# Altium footprint library Audio-Beamformer.PcbLib: 47 footprints (part 3 of 3)
Each footprint in its own frame and in the unit in brackets; x right, y up, seen from the top. Pads: shape width x height; smd on the part's side, far side on the other; paste and mask are expansions set on the pad; w line width, h text height; cw(c..) or ccw(c..) is an arc to the next point about the centre after c.
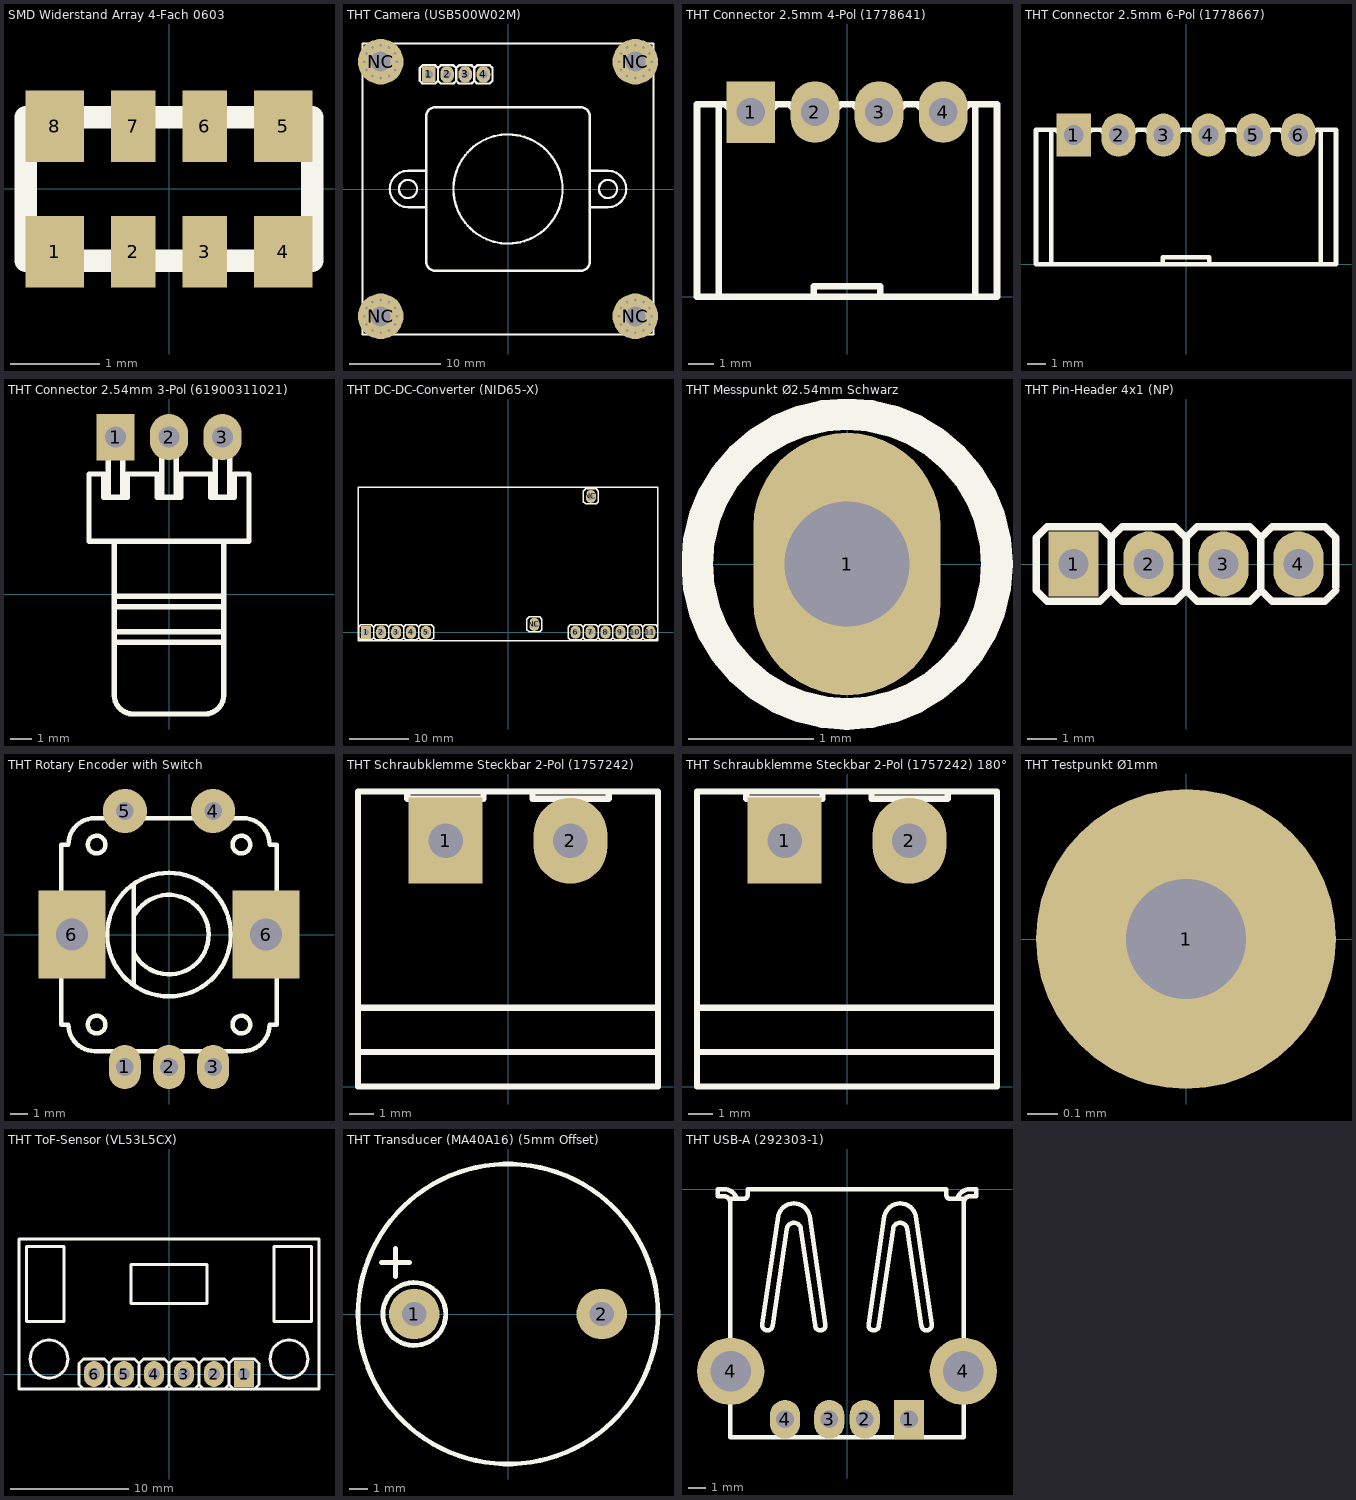
[diagram p2: the footprints below, top view; thin cyan lines are the x and y axes]

## SMD Widerstand Array 4-Fach 0603 [mm]
pads (8):
  rect 0.65x0.8 smd: 1(-1.275,-0.7) 4(1.275,-0.7) 5(1.275,0.7) 8(-1.275,0.7)
  rect 0.5x0.8 smd: 2(-0.4,-0.7) 3(0.4,-0.7) 6(0.4,0.7) 7(-0.4,0.7)
Top Overlay:
  lines w0.254: -1.6,-0.8 -1.6,0.8 1.6,0.8 1.6,-0.8 -1.6,-0.8
3D body "User Library-R-0603-Array-4-1.step": height 0.51, standoff -0.01, extent -1.6,-0.8 1.6,0.8

## THT Camera (USB500W02M) [mm] "Capacitor, Electrolytic, Radial; Body 5 x 5 mm (Dia.xH typ); Pin Spacing 2 mm (typ)"
height 6
pads (8):
  rect 1.5x1.8 hole 0.85: 1(-8.7,12.6)
  oval 1.5x1.8 hole 0.85: 2(-6.7,12.6) 3(-4.7,12.6) 4(-2.7,12.6)
  round 5 hole 2.2: NC(-14,-14) NC(-14,14) NC(14,-14) NC(14,14)
via 13.1,-15.559 diameter 0.62 hole 0.3
via 12.441,-13.1 diameter 0.62 hole 0.3
via 15.559,-14.9 diameter 0.62 hole 0.3
via 14.9,-12.441 diameter 0.62 hole 0.3
via 12.2,-14 diameter 0.62 hole 0.3
via 14,-12.2 diameter 0.62 hole 0.3
via 14,-15.8 diameter 0.62 hole 0.3
via 15.8,-14 diameter 0.62 hole 0.3
via 12.441,-14.9 diameter 0.62 hole 0.3
via 13.1,-12.441 diameter 0.62 hole 0.3
via 14.9,-15.559 diameter 0.62 hole 0.3
via 15.559,-13.1 diameter 0.62 hole 0.3
via -14.9,-15.559 diameter 0.62 hole 0.3
via -15.559,-13.1 diameter 0.62 hole 0.3
via -12.441,-14.9 diameter 0.62 hole 0.3
via -13.1,-12.441 diameter 0.62 hole 0.3
via -15.8,-14 diameter 0.62 hole 0.3
via -14,-12.2 diameter 0.62 hole 0.3
via -14,-15.8 diameter 0.62 hole 0.3
via -12.2,-14 diameter 0.62 hole 0.3
via -15.559,-14.9 diameter 0.62 hole 0.3
via -14.9,-12.441 diameter 0.62 hole 0.3
via -13.1,-15.559 diameter 0.62 hole 0.3
via -12.441,-13.1 diameter 0.62 hole 0.3
via -14.9,12.441 diameter 0.62 hole 0.3
via -15.559,14.9 diameter 0.62 hole 0.3
via -12.441,13.1 diameter 0.62 hole 0.3
via -13.1,15.559 diameter 0.62 hole 0.3
via -15.8,14 diameter 0.62 hole 0.3
via -14,15.8 diameter 0.62 hole 0.3
via -14,12.2 diameter 0.62 hole 0.3
via -12.2,14 diameter 0.62 hole 0.3
via -15.559,13.1 diameter 0.62 hole 0.3
via -14.9,15.559 diameter 0.62 hole 0.3
via -13.1,12.441 diameter 0.62 hole 0.3
via -12.441,14.9 diameter 0.62 hole 0.3
via 13.1,12.441 diameter 0.62 hole 0.3
via 12.441,14.9 diameter 0.62 hole 0.3
via 15.559,13.1 diameter 0.62 hole 0.3
via 14.9,15.559 diameter 0.62 hole 0.3
via 12.2,14 diameter 0.62 hole 0.3
via 14,15.8 diameter 0.62 hole 0.3
via 14,12.2 diameter 0.62 hole 0.3
via 15.8,14 diameter 0.62 hole 0.3
via 12.441,13.1 diameter 0.62 hole 0.3
via 13.1,15.559 diameter 0.62 hole 0.3
via 14.9,12.441 diameter 0.62 hole 0.3
via 15.559,14.9 diameter 0.62 hole 0.3
Top Overlay:
  circle w0.254: c11,0 r1
  circle w0.254: c-11,0 r1
  circle w0.254: c0,0 r6
  lines w0.254: -9,-2 -11,-2 cw(c-11,0) -11,2 -9,2 ; 9,-2 11,-2 ccw(c11,0) 11,2 9,2 ; -7.7,11.9 -7.4,11.6 -6,11.6 -5.7,11.9 ; -7.7,11.9 -7.7,13.3 ; -7.7,11.9 -8,11.6 -9.4,11.6 -9.7,11.9 -9.7,13.3 -9.4,13.6 -8,13.6 -7.7,13.3 ; -7.7,13.3 -7.4,13.6 -6,13.6 -5.7,13.3 ; -5.7,11.9 -5.4,11.6 -4,11.6 -3.7,11.9 ; -5.7,11.9 -5.7,13.3 ; -5.7,13.3 -5.4,13.6 -4,13.6 -3.7,13.3 ; -3.7,11.9 -3.7,13.3 ; -3.7,11.9 -3.4,11.6 -2,11.6 -1.7,11.9 -1.7,13.3 -2,13.6 -3.4,13.6 -3.7,13.3 ; -16,-16 -16,16 16,16 16,-16 -16,-16 ; -9,-8 ccw(c-8,-8) -8,-9 0,-9 8,-9 ccw(c8,-8) 9,-8 9,0 9,8 ccw(c8,8) 8,9 0,9 -8,9 ccw(c-8,8) -9,8 -9,0 -9,-8
3D body "Camera.x_t": height 21.12, standoff -2.35, extent -16.247,-16.25 16.247,16.25

## THT Connector 2.5mm 4-Pol (1778641) [mm] "Capacitor, Electrolytic, Radial; Body 5 x 5 mm (Dia.xH typ); Pin Spacing 2 mm (typ)"
height 6
pads (4):
  rect 1.9x2.4 hole 1.1: 1(-3.75,7.2)
  oval 1.9x2.4 hole 1.1: 2(-1.25,7.2) 3(1.25,7.2) 4(3.75,7.2)
Top Overlay:
  lines w0.254: -5,0 -5,7.5 ; -1.3,0 -1.3,0.4 0,0.4 1.3,0.4 1.3,0 ; 5,0 5,7.5 ; -5.85,0 -5.85,7 -5.85,7.5 -4.75,7.5 -4.25,7 -3.25,7 -2.75,7.5 -2.25,7.5 -1.75,7 -0.75,7 -0.25,7.5 0.25,7.5 0.75,7 1.75,7 2.25,7.5 2.5,7.5 2.75,7.5 3.25,7 4.25,7 4.75,7.5 5.85,7.5 5.85,7 5.85,0 2.5,0 -5.85,0
3D body "pxc_1778641_03_PTSM-0-5-4-HH-2-5-THR-R32_3D.stp": height 5.04, standoff -2.08, extent -5.86,0 5.86,7.5
3D body "pxc_1778858_02_PTSM-0-5-4-P-2-5_3D.stp": height 5.02, standoff 0.02, extent -5.55,-10.5 5.55,4.5

## THT Connector 2.5mm 6-Pol (1778667) [mm] "Capacitor, Electrolytic, Radial; Body 5 x 5 mm (Dia.xH typ); Pin Spacing 2 mm (typ)"
height 6
pads (6):
  rect 1.9x2.4 hole 1.1: 1(-6.25,7.2)
  oval 1.9x2.4 hole 1.1: 2(-3.75,7.2) 3(-1.25,7.2) 4(1.25,7.2) 5(3.75,7.2) 6(6.25,7.2)
Top Overlay:
  lines w0.254: -7.5,0 -7.5,7.5 ; -1.3,0 -1.3,0.4 0,0.4 1.3,0.4 1.3,0 ; 7.5,0 7.5,7.5 ; -8.35,0 0,0 8.35,0 8.35,7 8.35,7.5 7.25,7.5 6.75,7 5.75,7 5.25,7.5 4.75,7.5 4.25,7 3.25,7 2.75,7.5 2.25,7.5 1.75,7 0.75,7 0.25,7.5 0,7.5 -0.25,7.5 -0.75,7 -1.75,7 -2.25,7.5 -2.75,7.5 -3.25,7 -4.25,7 -4.75,7.5 -5.25,7.5 -5.75,7 -6.75,7 -7.25,7.5 -8.35,7.5 -8.35,7 -8.35,0
3D body "pxc_1778874_02_PTSM-0-5-6-P-2-5_3D.stp": height 5.02, standoff 0.02, extent -8.05,-10.5 8.05,4.5
3D body "pxc_1778667_03_PTSM-0-5-6-HH-2-5-THR-R32_3D.stp": height 5.04, standoff -2.08, extent -8.36,0 8.36,7.5

## THT Connector 2.54mm 3-Pol (61900311021) [mm] "Capacitor, Electrolytic, Radial; Body 5 x 5 mm (Dia.xH typ); Pin Spacing 2 mm (typ)"
height 6
pads (3):
  rect 1.8x2.2 hole 1: 1(-2.54,7.45)
  oval 1.8x2.2 hole 1: 2(0,7.45) 3(2.54,7.45)
Top Overlay:
  lines w0.254: -2.89,4.62 -2.89,7.8 -2.54,7.8 -2.19,7.8 -2.19,4.62 ; -2.6,-2.3 2.6,-2.3 ; -2.6,-1.8 2.6,-1.8 ; -2.6,-0.6 2.6,-0.6 ; -2.6,-0.1 2.6,-0.1 ; -2.6,2.5 -2.6,-4.8 ccw(c-1.7,-4.8) -1.7,-5.7 0,-5.7 1.7,-5.7 ccw(c1.7,-4.8) 2.6,-4.8 2.6,2.5 ; -0.35,4.62 -0.35,7.8 0,7.8 0.35,7.8 0.35,4.62 ; 2.19,4.62 2.19,7.8 2.54,7.8 2.89,7.8 2.89,4.62 ; -3.8,2.5 0,2.5 3.8,2.5 3.8,5.7 3.1,5.7 3.1,4.6 1.98,4.6 1.98,5.7 0.56,5.7 0.56,4.6 0,4.6 -0.56,4.6 -0.56,5.7 -1.98,5.7 -1.98,4.6 -3.1,4.6 -3.1,5.7 -3.8,5.7 -3.8,2.5
3D body "61900311021_Download_STP_61900311021_rev1.stp.x_t": height 5.85, standoff -3.35, extent -3.81,-5.75 3.81,7.77

## THT DC-DC-Converter (NID65-X) [mm] "Capacitor, Electrolytic, Radial; Body 5 x 5 mm (Dia.xH typ); Pin Spacing 2 mm (typ)"
height 6
pads (13):
  rect 1.7x2.2 hole 1: 1(-24.13,0)
  oval 1.7x2.2 hole 1: 2(-21.59,0) 3(-19.05,0) 4(-16.51,0) 5(-13.97,0) 6(11.43,0) 7(13.97,0) 8(16.51,0) 9(19.05,0) 10(21.59,0) 11(24.13,0) NC(4.411,1.35) NC(14.011,23.075)
Top Overlay:
  lines w0.254: -25.4,-0.889 -25.4,-0.762 -25.4,0.889 ; -25.4,-0.889 -25.019,-1.27 -23.241,-1.27 -22.86,-0.889 ; -25.4,-0.889 -25.4,0.889 ; -25.4,0.889 -25.019,1.27 -23.241,1.27 -22.86,0.889 ; -22.86,-0.889 -22.86,-0.762 -22.86,0.889 ; -22.86,-0.889 -22.479,-1.27 -20.701,-1.27 -20.32,-0.889 ; -22.86,-0.889 -22.86,0.889 ; -22.86,0.889 -22.479,1.27 -20.701,1.27 -20.32,0.889 ; -20.32,-0.889 -20.32,-0.762 -20.32,0.889 ; -20.32,-0.889 -19.939,-1.27 -18.161,-1.27 -17.78,-0.889 ; -20.32,-0.889 -20.32,0.889 ; -20.32,0.889 -19.939,1.27 -18.161,1.27 -17.78,0.889 ; -17.78,-0.889 -17.78,-0.762 -17.78,0.889 ; -17.78,-0.889 -17.399,-1.27 -15.621,-1.27 -15.24,-0.889 ; -17.78,-0.889 -17.78,0.889 ; -17.78,0.889 -17.399,1.27 -15.621,1.27 -15.24,0.889 ; -15.24,-0.889 -15.24,-0.762 -15.24,0.889 ; -15.24,-0.889 -14.859,-1.27 -13.081,-1.27 -12.7,-0.889 -12.7,0.889 -13.081,1.27 -14.859,1.27 -15.24,0.889 ; -15.24,-0.889 -15.24,0.889 ; 3.141,0.461 3.141,0.588 3.141,2.239 ; 3.141,0.461 3.522,0.08 5.3,0.08 5.681,0.461 ; 3.141,0.461 3.141,2.239 ; 3.141,2.239 3.522,2.62 5.3,2.62 5.681,2.239 ; 5.681,0.461 5.681,0.588 5.681,2.239 ; 5.681,0.461 5.681,2.239 ; 12.7,-0.889 12.319,-1.27 10.541,-1.27 10.16,-0.889 10.16,0.889 10.541,1.27 12.319,1.27 12.7,0.889 ; 12.7,-0.889 12.7,0.889 ; 12.7,-0.889 13.081,-1.27 14.859,-1.27 15.24,-0.889 ; 12.7,0.889 13.081,1.27 14.859,1.27 15.24,0.889 ; 12.741,22.186 12.741,22.313 12.741,23.964 ; 12.741,22.186 13.122,21.805 14.9,21.805 15.281,22.186 ; 12.741,22.186 12.741,23.964 ; 12.741,23.964 13.122,24.345 14.9,24.345 15.281,23.964 ; 15.24,-0.889 15.24,-0.762 15.24,0.889 ; 15.24,-0.889 15.24,0.889 ; 15.24,-0.889 15.621,-1.27 17.399,-1.27 17.78,-0.889 ; 15.24,0.889 15.621,1.27 17.399,1.27 17.78,0.889 ; 15.281,22.186 15.281,22.313 15.281,23.964 ; 15.281,22.186 15.281,23.964 ; 17.78,-0.889 17.78,-0.762 17.78,0.889 ; 17.78,-0.889 17.78,0.889 ; 17.78,-0.889 18.161,-1.27 19.939,-1.27 20.32,-0.889 ; 17.78,0.889 18.161,1.27 19.939,1.27 20.32,0.889 ; 20.32,-0.889 20.32,-0.762 20.32,0.889 ; 20.32,-0.889 20.32,0.889 ; 20.32,-0.889 20.701,-1.27 22.479,-1.27 22.86,-0.889 ; 20.32,0.889 20.701,1.27 22.479,1.27 22.86,0.889 ; 22.86,-0.889 22.86,-0.762 22.86,0.889 ; 22.86,-0.889 22.86,0.889 ; 22.86,-0.889 23.241,-1.27 25.019,-1.27 25.4,-0.889 ; 22.86,0.889 23.241,1.27 25.019,1.27 25.4,0.889 ; 25.4,-0.889 25.4,-0.762 25.4,0.889 ; 25.4,-0.889 25.4,0.889 ; -25.525,-1.4 25.425,-1.4 25.425,24.6 -25.525,24.6 -25.525,-1.4
3D body "NID65.x_t": height 10.25, standoff -2.65, extent -25.515,-1.4 25.415,24.6
3D body "NID65_Pin.x_t": height 5.35, standoff -2.65, extent 3.247,0.08 5.575,2.62
3D body "NID65_Pin.x_t": height 5.35, standoff -2.65, extent 12.847,21.805 15.175,24.345

## THT Messpunkt Ø2.54mm Schwarz [mm]
pads (1):
  oval 1.5x2.1 hole 1: 1(0,0)
Top Overlay:
  circle w0.254: c0,0 r1.2
3D body "User Library-Test Point Keystone - 5001 BLACK.STEP": height 4.57, standoff -3.05, extent -1.27,-1.27 1.27,1.27

## THT Pin-Header 4x1 (NP) [mm] "Capacitor, Electrolytic, Radial; Body 5 x 5 mm (Dia.xH typ); Pin Spacing 2 mm (typ)"
height 6
pads (4):
  rect 1.7x2.2 hole 1: 1(-3.81,0)
  oval 1.7x2.2 hole 1: 2(-1.27,0) 3(1.27,0) 4(3.81,0)
Top Overlay:
  lines w0.254: 5.08,-0.889 4.699,-1.27 2.921,-1.27 2.54,-0.889 ; 5.08,-0.762 5.08,0.889 4.699,1.27 2.921,1.27 2.54,0.889 ; -5.08,-0.889 -5.08,0.889 ; -5.08,-0.889 -4.699,-1.27 -2.921,-1.27 -2.54,-0.889 ; -5.08,-0.889 -5.08,-0.762 -5.08,0.889 ; -5.08,0.889 -4.699,1.27 -2.921,1.27 -2.54,0.889 ; -2.54,-0.889 -2.54,0.889 ; -2.54,-0.889 -2.159,-1.27 -0.381,-1.27 0,-0.889 ; -2.54,-0.889 -2.54,-0.762 -2.54,0.889 ; -2.54,0.889 -2.159,1.27 -0.381,1.27 0,0.889 ; 0,-0.889 0,0.889 ; 0,-0.889 0.381,-1.27 2.159,-1.27 2.54,-0.889 ; 0,-0.889 0,-0.762 0,0.889 ; 0,0.889 0.381,1.27 2.159,1.27 2.54,0.889 ; 2.54,-0.889 2.54,0.889 ; 2.54,-0.889 2.54,-0.762 2.54,0.889

## THT Rotary Encoder with Switch [mm]
pads (7):
  oval 1.8x2.5 hole 1: 1(-2.5,-7.5) 2(0,-7.5) 3(2.5,-7.5)
  round 2.5 hole 1: 4(2.5,7) 5(-2.5,7)
  rect 3.8x5 hole 1.8 square: 6(-5.5,0) 6(5.5,0)
Top Overlay:
  circle w0.254: c4.1,-5.1 r0.5
  circle w0.254: c-4.1,-5.1 r0.5
  circle w0.254: c4.1,5.1 r0.5
  circle w0.254: c-4.1,5.1 r0.5
  circle w0.254: c0,0 r3.5
  lines w0.254: -2.002,1.026 cw(c0,0) -1.992,-1.046 ; -2,-2.8 -2,2.8 ; -6.1,-5.1 -6.1,0 -6.1,5.1 -5.7,5.1 cw(c-4.2,5.1) -4.2,6.6 0,6.6 4.2,6.6 cw(c4.2,5.1) 5.7,5.1 6.1,5.1 6.1,0 6.1,-5.1 5.7,-5.1 cw(c4.2,-5.1) 4.2,-6.6 0,-6.6 -4.2,-6.6 cw(c-4.2,-5.1) -5.7,-5.1 -6.1,-5.1
3D body "pec11r-4025f-n0024.x_t": height 31.62, standoff -3.58, extent -7,-7.7 7,7.2

## THT Schraubklemme Steckbar 2-Pol (1757242) [mm]
height 7.4
pads (2):
  rect 3x3.5 hole 1.4: 1(-2.54,10)
  oval 3x3.5 hole 1.4: 2(2.54,10)
Top Overlay:
  lines w0.254: -6.1,1.4 0,1.4 6.1,1.4 ; -6.1,3.2 0,3.2 6.1,3.2 ; -4.1,12 -4.1,11.7 -1,11.7 -1,12 ; 1,12 1,11.7 4.1,11.7 4.1,12 ; -6.1,0 0,0 6.1,0 6.1,12 0,12 -6.1,12 -6.1,0
3D body "pxc_1779987_05_MSTBT-2-5-2-ST-5-08_3D.x_t": height 10.2, standoff -4.8, extent -5.08,-9.83 5.08,8.37
3D body "pxc_1757242_06_MSTBA-2-5-2-G-5-08_3D.x_t": height 8.61, standoff -3.49, extent -6.08,0 6.08,12.002

## THT Schraubklemme Steckbar 2-Pol (1757242) 180° [mm]
height 7.4
pads (2):
  rect 3x3.5 hole 1.4: 1(-2.54,10)
  oval 3x3.5 hole 1.4: 2(2.54,10)
Top Overlay:
  lines w0.254: -6.1,1.4 0,1.4 6.1,1.4 ; -6.1,3.2 0,3.2 6.1,3.2 ; -4.1,12 -4.1,11.7 -1,11.7 -1,12 ; 1,12 1,11.7 4.1,11.7 4.1,12 ; -6.1,0 0,0 6.1,0 6.1,12 0,12 -6.1,12 -6.1,0
3D body "pxc_1757019_07_MSTB-2-5-2-ST-5-08_3D.stp": height 15.01, standoff 0.01, extent -5.11,-9.5 5.11,8.8
3D body "pxc_1757242_06_MSTBA-2-5-2-G-5-08_3D.x_t": height 8.61, standoff -3.49, extent -6.08,0 6.08,12.002

## THT Testpunkt Ø1mm [mm]
pads (1):
  round 1 hole 0.4: 1(0,0)

## THT ToF-Sensor (VL53L5CX) [mm] "Capacitor, Electrolytic, Radial; Body 5 x 5 mm (Dia.xH typ); Pin Spacing 2 mm (typ)"
height 6
pads (6):
  rect 1.7x2.2 hole 1: 1(6.35,0)
  oval 1.7x2.2 hole 1: 2(3.81,0) 3(1.27,0) 4(-1.27,0) 5(-3.81,0) 6(-6.35,0)
Top Overlay:
  circle w0.254: c-10.16,1.27 r1.6
  circle w0.254: c10.16,1.27 r1.6
  lines w0.254: -7.62,0.762 -7.62,-0.889 -7.239,-1.27 -5.461,-1.27 -5.08,-0.889 ; -7.62,0.889 -7.239,1.27 -5.461,1.27 -5.08,0.889 -4.699,1.27 -2.921,1.27 -2.54,0.889 -2.159,1.27 -0.381,1.27 0,0.889 ; -5.08,0.762 -5.08,-0.889 ; -2.54,0.762 -2.54,-0.889 ; -5.08,-0.889 -4.699,-1.27 -2.921,-1.27 -2.54,-0.889 ; -2.54,-0.889 -2.159,-1.27 -0.381,-1.27 0,-0.889 ; 0,-0.889 0,0.889 ; 0,-0.889 0.381,-1.27 2.159,-1.27 2.54,-0.889 ; 0,-0.889 0,0.762 0,0.889 ; 0,0.889 0.381,1.27 2.159,1.27 2.54,0.889 ; 2.54,-0.889 2.54,0.889 ; 2.54,-0.889 2.921,-1.27 4.699,-1.27 5.08,-0.889 ; 2.54,-0.889 2.54,0.762 2.54,0.889 ; 2.54,0.889 2.921,1.27 4.699,1.27 5.08,0.889 ; 5.08,-0.889 5.08,0.889 ; 5.08,-0.889 5.461,-1.27 7.239,-1.27 7.62,-0.889 ; 5.08,-0.889 5.08,0.762 5.08,0.889 ; 5.08,0.889 5.461,1.27 7.239,1.27 7.62,0.889 ; 7.62,-0.889 7.62,0.889 ; 7.62,-0.889 7.62,0.762 7.62,0.889 ; -12.7,-1.27 -12.7,11.43 12.7,11.43 12.7,-1.27 -12.7,-1.27 ; -12.065,4.445 -12.065,10.795 -8.89,10.795 -8.89,4.445 -12.065,4.445 ; -3.2,5.97 3.2,5.97 3.2,9.27 -3.2,9.27 -3.2,5.97 ; 8.89,4.445 12.065,4.445 12.065,10.795 8.89,10.795 8.89,4.445
3D body "6-Pin Header - Male - 2.54mm.x_t": height 14, standoff -3.05, extent -7.62,-1.27 7.62,1.27
3D body "ToF-Sensor.x_t": height 15.5, standoff 8.75, extent -12.7,-1.27 12.7,11.43

## THT Transducer (MA40A16) (5mm Offset) [mm] "Capacitor, Electrolytic, Radial; Body 5 x 5 mm (Dia.xH typ); Pin Spacing 2 mm (typ)"
height 6
pads (2):
  round 2.7 hole 1.3: 1(-5,0) 2(5,0)
Top Overlay:
  circle w0.254: c0,0 r8
  circle w0.254: c-5,0 r1.677
  lines w0.254: -6.75,2.75 -5.25,2.75 ; -6,2 -6,3.5
3D body "User Library-400PT160_LongLeads.x_t": height 17, standoff -3.2, extent -8.1,-8.1 8.1,8.1

## THT USB-A (292303-1) [mm] "Capacitor, Electrolytic, Radial; Body 5 x 5 mm (Dia.xH typ); Pin Spacing 2 mm (typ)"
height 6
pads (6):
  rect 1.7x2.2 hole 1: 1(3.5,-12.99)
  oval 1.7x2.2 hole 1: 2(1,-12.99) 3(-1,-12.99) 4(-3.5,-12.99)
  round 3.8 hole 2.3: 4(-6.57,-10.28) 4(6.57,-10.28)
Top Overlay:
  lines w0.254: -6.941,0 cw(c-6.941,-0.741) -6.226,-0.55 ; -6.9,0 -7.3,0 -7.3,-0.4 -6.941,-0.4 cw(c-6.941,-0.741) -6.6,-0.741 -6.6,-14 0,-14 6.6,-14 6.6,-0.741 cw(c6.941,-0.741) 6.941,-0.4 7.3,-0.4 7.3,0 6.9,0 ; -6.6,-11.2 -7,-11.2 -7.3,-10.9 -7.3,-10.3 -7.3,-9.7 -7,-9.4 -6.6,-9.4 ; -6.6,-0.55 -6.226,-0.55 ; 6.6,-11.2 7,-11.2 7.3,-10.9 7.3,-10.3 7.3,-9.7 7,-9.4 6.6,-9.4 ; 6.6,-0.55 6.226,-0.55 ; 6.941,0 ccw(c6.941,-0.741) 6.226,-0.55 ; -6.226,-0.55 -5.85,-0.55 ccw(c-5.85,-0.3) -5.6,-0.3 -5.6,0 0,0 5.6,0 5.6,-0.3 ccw(c5.85,-0.3) 5.85,-0.55 6.226,-0.55 ; -4.776,-7.604 ccw(c-4.493,-7.679) -4.2,-7.7 -3.401,-2.235 cw(c-3,-2.3) -3,-1.894 cw(c-3,-2.3) -2.599,-2.235 -1.8,-7.7 ccw(c-1.507,-7.679) -1.224,-7.604 -2.116,-1.504 ccw(c-3,-1.707) -3.884,-1.504 -4.776,-7.604 ; 1.224,-7.604 ccw(c1.507,-7.679) 1.8,-7.7 2.599,-2.235 cw(c3,-2.3) 3,-1.894 cw(c3,-2.3) 3.401,-2.235 4.2,-7.7 ccw(c4.493,-7.679) 4.776,-7.604 3.884,-1.504 ccw(c3,-1.707) 2.116,-1.504 1.224,-7.604
3D body "c-292303-1-e4-3d.x_t": height 7.77, standoff -3.59, extent -8.117,-14 8.117,0